# Altium footprint library MyPcbLib.PcbLib: 657 footprints (part 17 of 42)
Each footprint in its own frame and in the unit in brackets; x right, y up, seen from the top. Pads: shape width x height; smd on the part's side, far side on the other; paste and mask are expansions set on the pad; w line width, h text height; cw(c..) or ccw(c..) is an arc to the next point about the centre after c.
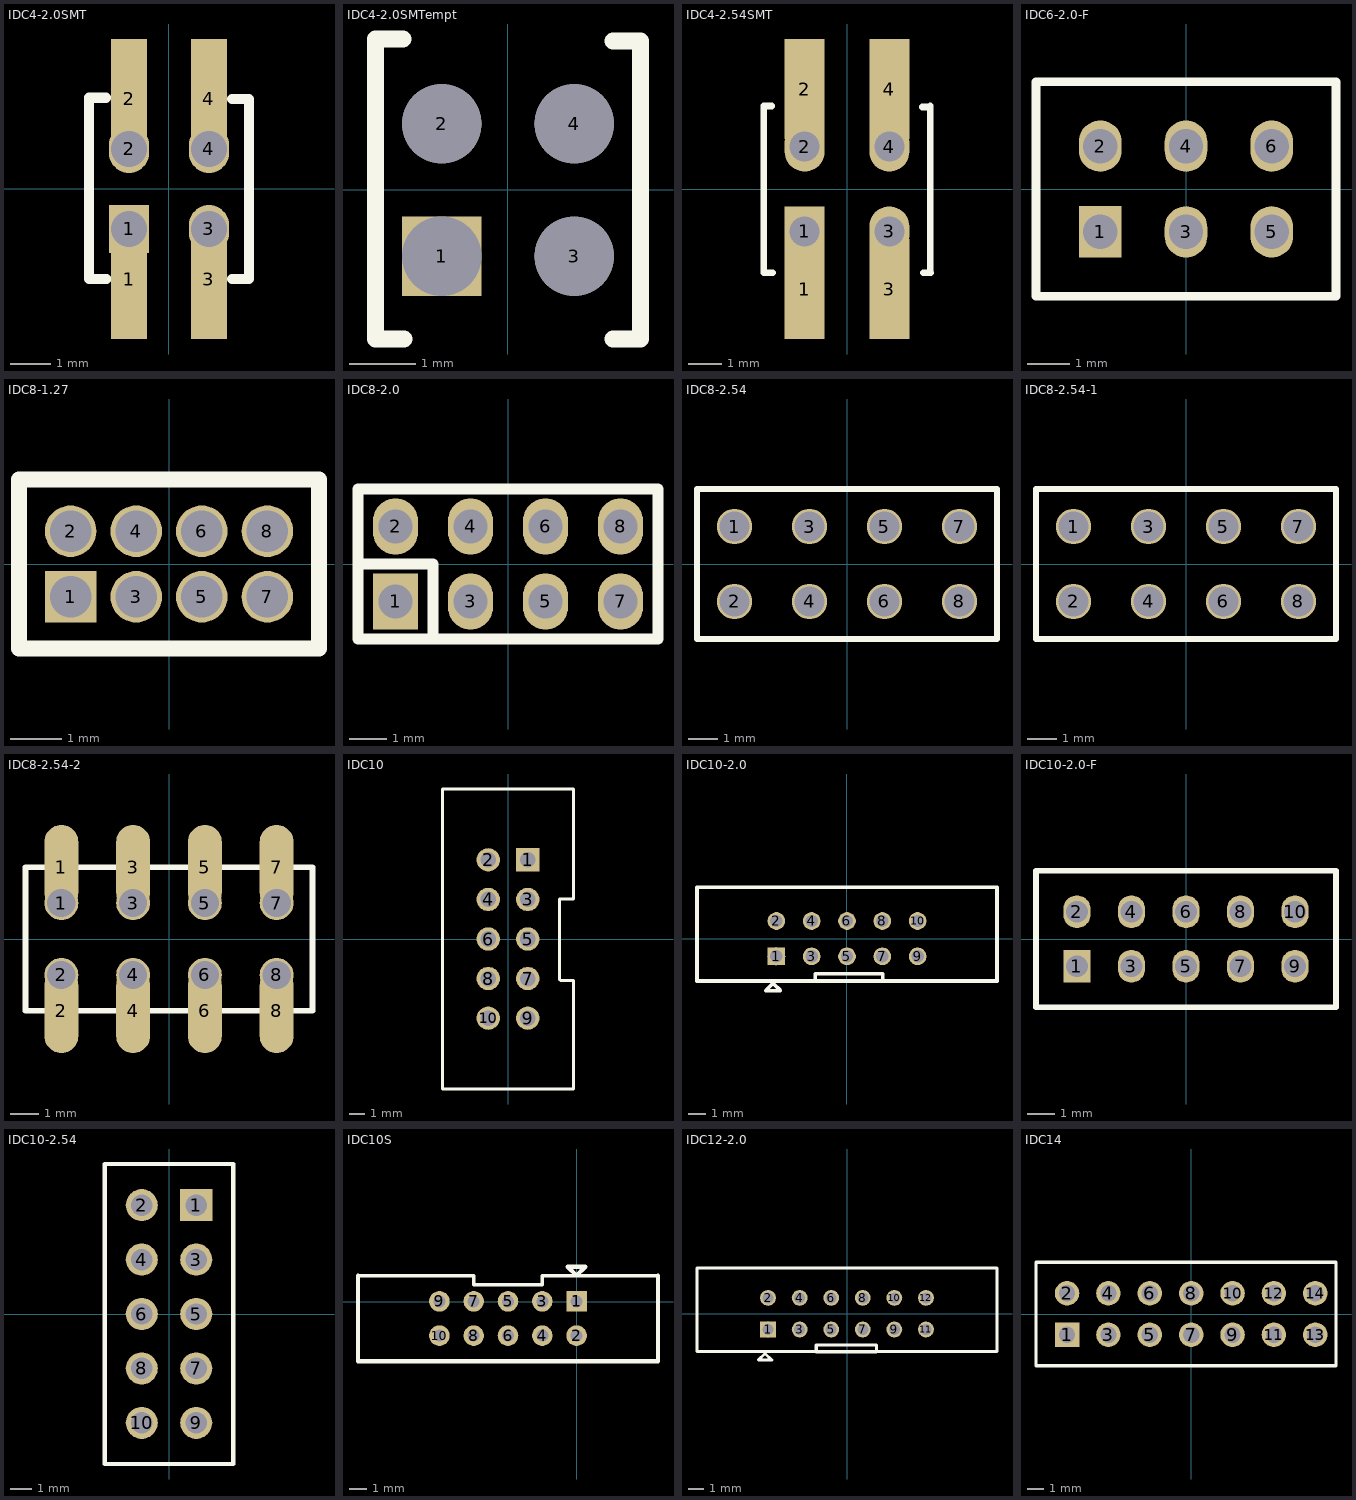
[diagram p16: the footprints below, top view; thin cyan lines are the x and y axes]

## IDC4-2.0SMT [mm]
pads (8):
  rect 0.89x3 smd: 1(-1,-2.25) 2(-1,2.25) 3(1,-2.25) 4(1,2.25)
  rect 1x1.2 hole 0.9: 1(-1,-1)
  oval 1x1.2 hole 0.9: 2(-1,1) 3(1,-1) 4(1,1)
Top Overlay:
  lines w0.254: -2,2.25 -2,-2.25 -1.567,-2.25 ; -2,2.28 -1.581,2.28 ; 1.581,-2.25 2,-2.25 2,2.25 1.581,2.25
3D body: height 4, standoff -0.4, extent -1.949,-2.032 2.051,1.968

## IDC4-2.0SMTempt [mm]
pads (4):
  rect 1.2x1.2 hole 1.2: 1(-1,-1)
  round 1.2 hole 1.2: 2(-1,1) 3(1,-1) 4(1,1)
Top Overlay:
  lines w0.254: -2,2.25 -2,-2.25 -1.567,-2.25 ; -2,2.28 -1.581,2.28 ; 1.581,-2.25 2,-2.25 2,2.25 1.581,2.25

## IDC4-2.54SMT [mm]
pads (8):
  rect 1.2x3 smd: 1(-1.27,-3) 2(-1.27,3) 3(1.27,-3) 4(1.27,3)
  rect 1.2x1.5 hole 0.9: 1(-1.27,-1.27)
  oval 1.2x1.5 hole 0.9: 2(-1.27,1.27) 3(1.27,-1.27) 4(1.27,1.27)
Top Overlay:
  lines w0.203: -2.5,-2.5 -2.5,2.5 ; -2.489,-2.515 -2.235,-2.515 ; -2.489,2.489 -2.261,2.489 ; 2.261,2.464 2.5,2.464 ; 2.286,-2.515 2.515,-2.515 ; 2.5,-2.5 2.5,2.5

## IDC6-2.0-F [mm]
pads (6):
  rect 1x1.2 hole 0.8: 1(-2,-1)
  oval 1x1.2 hole 0.8: 2(-2,1) 3(0,-1) 4(0,1) 5(2,-1) 6(2,1)
Top Overlay:
  lines w0.203: -3.5,-2.5 3.5,-2.5 3.5,2.5 -3.5,2.5 -3.5,-2.5

## IDC8-1.27 [mm]
pads (8):
  rect 1x1 hole 0.8: 1(-1.905,-0.635)
  round 1 hole 0.8: 2(-1.905,0.635) 3(-0.635,-0.635) 4(-0.635,0.635) 5(0.635,-0.635) 6(0.635,0.635) 7(1.905,-0.635) 8(1.905,0.635)
Top Overlay:
  lines w0.305: -2.905,-1.635 2.905,-1.635 2.905,1.635 -2.905,1.635 -2.905,-1.635

## IDC8-2.0 [mm]
pads (8):
  rect 1.2x1.5 hole 0.9: 1(-3,-1)
  oval 1.2x1.5 hole 0.9: 2(-3,1) 3(-1,-1) 4(-1,1) 5(1,-1) 6(1,1) 7(3,-1) 8(3,1)
Top Overlay:
  lines w0.305: -4,0 -2,0 -2,-2 ; -4,-2 -4,2 4,2 4,-2 -4,-2

## IDC8-2.54 [mm]
pads (8):
  round 1.2 hole 1: 1(-3.81,1.27) 2(-3.81,-1.27) 3(-1.27,1.27) 4(-1.27,-1.27) 5(1.27,1.27) 6(1.27,-1.27) 7(3.81,1.27) 8(3.81,-1.27)
Top Overlay:
  lines w0.203: -5.08,-2.54 -5.08,2.54 5.08,2.54 5.08,-2.54 -5.08,-2.54
3D body: height 7.62, standoff -1.6, extent -5.08,-2.54 5.08,2.46

## IDC8-2.54-1 [mm]
pads (8):
  round 1.2 hole 1: 1(-3.81,1.27) 2(-3.81,-1.27) 3(-1.27,1.27) 4(-1.27,-1.27) 5(1.27,1.27) 6(1.27,-1.27) 7(3.81,1.27) 8(3.81,-1.27)
Top Overlay:
  lines w0.203: -5.08,-2.54 -5.08,2.54 5.08,2.54 5.08,-2.54 -5.08,-2.54
3D body: height 8, standoff -1.6, extent -5.08,-2.54 5.08,2.54

## IDC8-2.54-2 [mm]
pads (16):
  round 1.2 hole 1: 1(-3.81,1.27) 2(-3.81,-1.27) 3(-1.27,1.27) 4(-1.27,-1.27) 5(1.27,1.27) 6(1.27,-1.27) 7(3.81,1.27) 8(3.81,-1.27)
  oval 1.2x3 smd: 1(-3.81,2.54) 2(-3.81,-2.54) 3(-1.27,2.54) 4(-1.27,-2.54) 5(1.27,2.54) 6(1.27,-2.54) 7(3.81,2.54) 8(3.81,-2.54)
Top Overlay:
  lines w0.203: -5.08,-2.54 -5.08,2.54 5.08,2.54 5.08,-2.54 -5.08,-2.54
3D body: height 8, standoff 0, extent -5.08,-3.81 5.08,3.27

## IDC10 [mm]
pads (10):
  rect 1.5x1.5 hole 1: 1(1.27,5.08)
  round 1.5 hole 1: 2(-1.27,5.08) 3(1.27,2.54) 4(-1.27,2.54) 5(1.27,0) 6(-1.27,0) 7(1.27,-2.54) 8(-1.27,-2.54) 9(1.27,-5.08) 10(-1.27,-5.08)
Top Overlay:
  lines w0.203: -4.2,-9.635 4.2,-9.635 ; -4.2,-9.55 -4.2,9.576 ; -4.2,9.635 4.2,9.635 ; 4.2,-9.576 4.2,-2.658 3.369,-2.658 3.318,-2.607 3.318,2.574 4.2,2.574 4.2,9.601
3D body: height 7.25, standoff -1.75, extent -3.975,-9.669 4.025,9.601

## IDC10-2.0 [mm]
pads (10):
  rect 1x1 hole 0.7: 1(-4,-1)
  round 1 hole 0.7: 2(-4,1) 3(-2,-1) 4(-2,1) 5(0,-1) 6(0,1) 7(2,-1) 8(2,1) 9(4,-1) 10(4,1)
Top Overlay:
  circle w0.05: c-4,-1 r0.35
  lines w0.05: -4.5,-1 -3.5,-1 ; -4,-1.5 -4,-0.5
  lines w0.2: -8.5,-2.4 8.5,-2.4 8.5,2.9 -8.5,2.9 -8.5,-2.4 ; -4.61,-2.94 -4.19,-2.52 -3.77,-2.94 -4.61,-2.94 ; -1.79,-2.41 -1.79,-1.98 2.02,-1.98 2.02,-2.41 -1.79,-2.41

## IDC10-2.0-F [mm]
pads (10):
  rect 1x1.2 hole 0.8: 1(-4,-1)
  oval 1x1.2 hole 0.8: 2(-4,1) 3(-2,-1) 4(-2,1) 5(0,-1) 6(0,1) 7(2,-1) 8(2,1) 9(4,-1) 10(4,1)
Top Overlay:
  lines w0.203: -5.5,-2.5 5.5,-2.5 5.5,2.5 -5.5,2.5 -5.5,-2.5

## IDC10-2.54 [mm]
pads (10):
  rect 1.5x1.5 hole 1: 1(1.27,5.08)
  round 1.5 hole 1: 2(-1.27,5.08) 3(1.27,2.54) 4(-1.27,2.54) 5(1.27,0) 6(-1.27,0) 7(1.27,-2.54) 8(-1.27,-2.54) 9(1.27,-5.08) 10(-1.27,-5.08)
Top Overlay:
  lines w0.203: -3,-7 3,-7 3,7 -3,7 -3,-7

## IDC10S [mm]
pads (10):
  rect 1.2x1.2 hole 0.7: 1(-0.006,0.022)
  round 1.2 hole 0.7: 2(-0.006,-1.978) 3(-2.006,0.022) 4(-2.006,-1.978) 5(-4.006,0.022) 6(-4.006,-1.978) 7(-6.006,0.022) 8(-6.006,-1.978) 9(-8.006,0.022) 10(-8.006,-1.978)
Top Overlay:
  lines w0.2: -12.756,1.522 -6.006,1.522 -6.006,0.997 -2.006,0.997 -2.006,1.522 4.744,1.522
  lines w0.254: -12.756,1.522 -12.756,-3.478 4.744,-3.478 4.744,1.522 ; -0.52,2.042 0.496,2.042 -0.012,1.534 -0.52,2.042

## IDC12-2.0 [mm]
pads (12):
  rect 1x1 hole 0.7: 1(-5,-1)
  round 1 hole 0.7: 2(-5,1) 3(-3,-1) 4(-3,1) 5(-1,-1) 6(-1,1) 7(1,-1) 8(1,1) 9(3,-1) 10(3,1) 11(5,-1) 12(5,1)
Top Overlay:
  circle w0.05: c-5,-1 r0.35
  lines w0.05: -5.5,-1 -4.5,-1 ; -5,-1.5 -5,-0.5
  lines w0.2: -9.5,-2.4 -9.5,2.9 9.5,2.9 9.5,-2.4 -9.5,-2.4 ; -5.61,-2.94 -4.77,-2.94 -5.19,-2.52 -5.61,-2.94 ; -1.952,-2.41 1.858,-2.41 1.858,-1.98 -1.952,-1.98 -1.952,-2.41
3D body: height 1.1, standoff -7.5, extent -9.498,-2.845 9.702,2.855

## IDC14 [mm]
pads (14):
  rect 1.5x1.5 hole 1: 1(-7.62,-1.27)
  round 1.5 hole 1: 2(-7.62,1.27) 3(-5.08,-1.27) 4(-5.08,1.27) 5(-2.54,-1.27) 6(-2.54,1.27) 7(0,-1.27) 8(0,1.27) 9(2.54,-1.27) 10(2.54,1.27) 11(5.08,-1.27) 12(5.08,1.27) 13(7.62,-1.27) 14(7.62,1.27)
Top Overlay:
  lines w0.203: -9.525,-3.175 -9.525,3.175 -8.89,3.175 8.89,3.175 8.89,-3.175 -9.525,-3.175